# Altium footprint library SG__PCB_Modules.PcbLib: 73 footprints (part 5 of 5)
Each footprint in its own frame and in the unit in brackets; x right, y up, seen from the top. Pads: shape width x height; smd on the part's side, far side on the other; paste and mask are expansions set on the pad; w line width, h text height; cw(c..) or ccw(c..) is an arc to the next point about the centre after c.
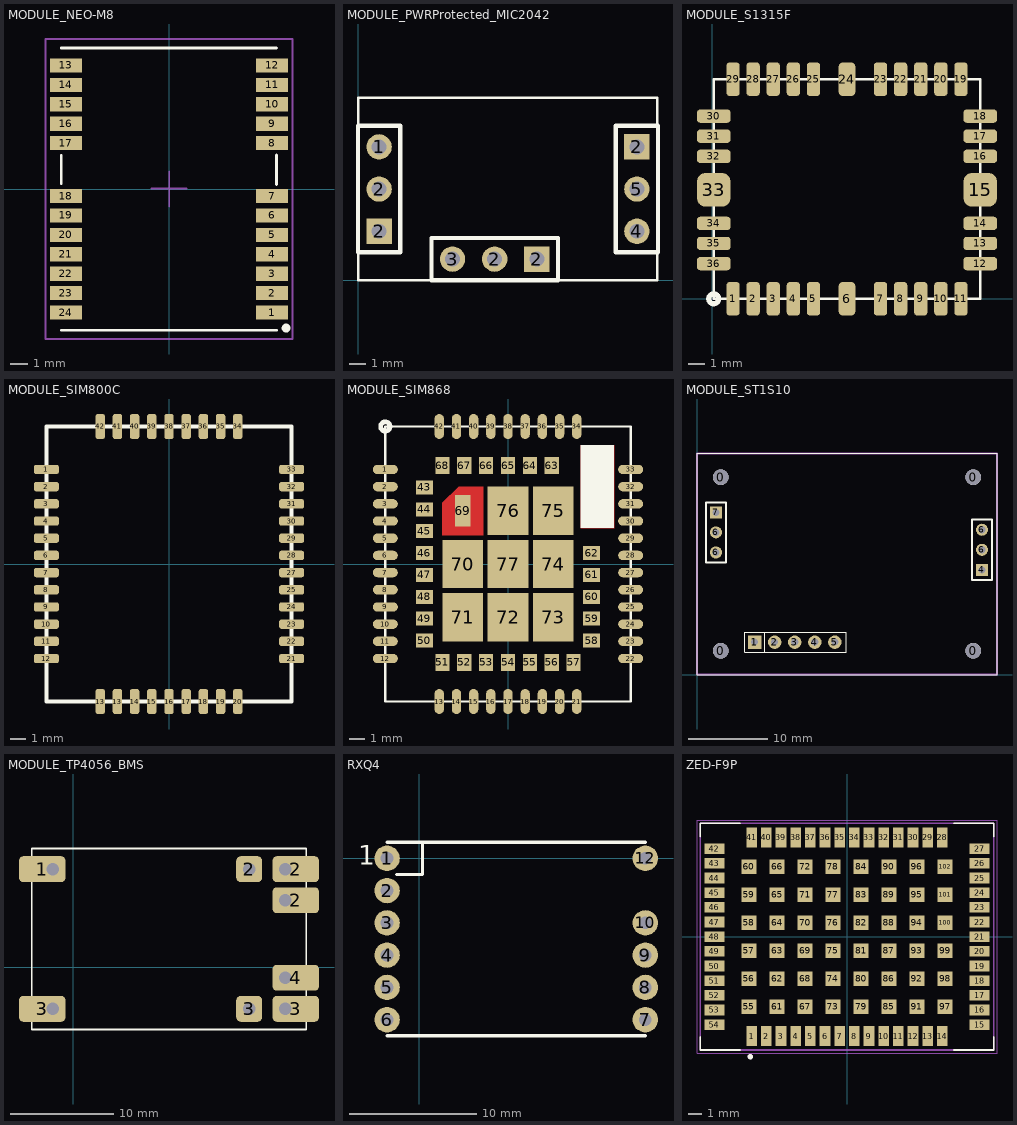
[diagram p4: the footprints below, top view; thin cyan lines are the x and y axes]

## MODULE_NEO-M8 [mm] "u-blox NEO GNSS module"
pads (24):
  rect 1.8x0.8 smd paste-0.1: 1(5.842,-7) 2(5.842,-5.9) 3(5.842,-4.8) 4(5.842,-3.7) 5(5.842,-2.6) 6(5.842,-1.5) 7(5.842,-0.4) 8(5.842,2.6) 9(5.842,3.7) 10(5.842,4.8) 11(5.842,5.9) 12(5.842,7) 13(-5.842,7) 14(-5.842,5.9) 15(-5.842,4.8) 16(-5.842,3.7) 17(-5.842,2.6) 18(-5.842,-0.4) 19(-5.842,-1.5) 20(-5.842,-2.6) 21(-5.842,-3.7) 22(-5.842,-4.8) 23(-5.842,-5.9) 24(-5.842,-7)
Top Overlay:
  circle w0.38: c6.636,-7.879 r0.058
  lines w0.16: -6.109,-8 6.096,-8 ; -6.109,7.996 6.09,7.996 ; -6.102,0.299 -6.102,1.893 ; 6.096,0.255 6.096,1.919
Top Paste:
  rectangle: -6.833,-4.1 -5.633,-3.3
  rectangle: -6.833,-7.4 -5.633,-6.6
  rectangle: -6.833,-6.3 -5.633,-5.5
  rectangle: -6.833,-5.2 -5.633,-4.4
  rectangle: -6.833,-3 -5.633,-2.2
  rectangle: -6.833,-1.9 -5.633,-1.1
  rectangle: -6.833,-0.8 -5.633,0
  rectangle: -6.833,2.2 -5.633,3
  rectangle: -6.833,3.3 -5.633,4.1
  rectangle: -6.833,4.4 -5.633,5.2
  rectangle: -6.833,5.5 -5.633,6.3
  rectangle: -6.833,6.6 -5.633,7.4
  rectangle: 5.642,6.6 6.842,7.4
  rectangle: 5.642,5.5 6.842,6.3
  rectangle: 5.642,4.4 6.842,5.2
  rectangle: 5.642,3.3 6.842,4.1
  rectangle: 5.642,2.2 6.842,3
  rectangle: 5.642,-0.8 6.842,0
  rectangle: 5.642,-1.9 6.842,-1.1
  rectangle: 5.642,-3 6.842,-2.2
  rectangle: 5.642,-4.1 6.842,-3.3
  rectangle: 5.642,-5.2 6.842,-4.4
  rectangle: 5.642,-6.3 6.842,-5.5
  rectangle: 5.642,-7.4 6.842,-6.6
Mechanical 13:
  text ".Designator" at -5.585,9.867 h1
Mechanical 15:
  lines w0.1: -1,0.024 0.02,0.024 ; 0.02,-1 0.02,0.024 ; 0.02,1 0.02,0.024 ; 1,0.024 0.02,0.024 ; -7,-8.5 -7,8.5 7,8.5 7,-8.5 -7,-8.5
3D body "NEO (STEP-AP214)_B.STEP": height 2.28, standoff -0.05, extent -6.104,-8 6.096,8

## MODULE_PWRProtected_MIC2042 [mil]
pads (9):
  round 60 hole 35.43: 1(49.16,316.38) 2(49.16,216.38) 2(323.16,50.38) 3(223.16,50.38) 4(660.16,116.38) 5(660.16,216.38)
  rect 60x60 hole 35.43: 2(49.16,116.38) 2(423.16,50.38) 2(660.16,316.38)
Top Overlay:
  lines w6: 0,0 708.66,0 708.66,433.07 0,433.07 0,0
  lines w10: -0.84,66.38 99.16,66.38 99.16,366.38 -0.84,366.38 -0.84,66.38 ; 173.16,0.38 473.16,0.38 473.16,100.38 173.16,100.38 173.16,0.38 ; 610.16,66.38 710.16,66.38 710.16,366.38 610.16,366.38 610.16,66.38
3D body "PLS1.stp": height 336.22, standoff -118.11, extent -0.85,266.38 99.15,366.38
3D body "PLS1.stp": height 336.22, standoff -118.11, extent -0.85,166.38 99.15,266.38
3D body "PLS1.stp": height 336.22, standoff -118.11, extent -0.85,66.38 99.15,166.38
3D body "PLS1.stp": height 336.22, standoff -118.11, extent 610.16,66.38 710.16,166.38
3D body "PLS1.stp": height 336.22, standoff -118.11, extent 610.16,166.38 710.16,266.38
3D body "PLS1.stp": height 336.22, standoff -118.11, extent 610.16,266.38 710.16,366.38
3D body "PLS1.stp": height 336.22, standoff -118.11, extent 173.15,0.38 273.15,100.38
3D body "PLS1.stp": height 336.22, standoff -118.11, extent 273.15,0.38 373.15,100.38
3D body "PLS1.stp": height 336.22, standoff -118.11, extent 373.15,0.38 473.15,100.38

## MODULE_S1315F [mm]
pads (36):
  rrect50% 0.8x2 smd mask+0.05: 1(1.25,0) 2(2.45,0) 3(3.65,0) 4(4.85,0) 5(6.05,0) 7(10.05,0) 8(11.25,0) 9(12.45,0) 10(13.65,0) 11(14.85,0) 19(14.85,13.1) 20(13.65,13.1) 21(12.45,13.1) 22(11.25,13.1) 23(10.05,13.1) 25(6.05,13.1) 26(4.85,13.1) 27(3.65,13.1) 28(2.45,13.1) 29(1.25,13.1)
  rrect50% 1x2 smd mask+0.05: 6(8.05,0) 24(8.05,13.1)
  rrect50% 2x0.8 smd mask+0.05: 12(16,2.1) 13(16,3.3) 14(16,4.5) 16(16,8.5) 17(16,9.7) 18(16,10.9) 30(0.1,10.9) 31(0.1,9.7) 32(0.1,8.5) 34(0.1,4.5) 35(0.1,3.3) 36(0.1,2.1)
  rrect50% 2x2 smd mask+0.05: 15(16,6.5) 33(0.1,6.5)
Top Overlay:
  circle w0.3: c0.1,0 r0.3
  lines w0.152: 0.1,0 16,0 16,13.1 0.1,13.1 0.1,0
3D body: height 1.5, standoff 0.1, extent 0.1,0 16,13.1

## MODULE_SIM800C [mm] "SIM800C"
pads (42):
  rrect50% 1.6x0.6 smd: 1(-7.85,6.05) 2(-7.85,4.95) 3(-7.85,3.85) 4(-7.85,2.75) 5(-7.85,1.65) 6(-7.85,0.55) 7(-7.85,-0.55) 8(-7.85,-1.65) 9(-7.85,-2.75) 10(-7.85,-3.85) 11(-7.85,-4.95) 12(-7.85,-6.05) 21(7.85,-6.05) 22(7.85,-4.95) 23(7.85,-3.85) 24(7.85,-2.75) 25(7.85,-1.65) 27(7.85,-0.55) 28(7.85,0.55) 29(7.85,1.65) 30(7.85,2.75) 31(7.85,3.85) 32(7.85,4.95) 33(7.85,6.05)
  rrect50% 0.6x1.6 smd: 13(-4.4,-8.8) 13(-3.3,-8.8) 14(-2.2,-8.8) 15(-1.1,-8.8) 16(0,-8.8) 17(1.1,-8.8) 18(2.2,-8.8) 19(3.3,-8.8) 20(4.4,-8.8) 34(4.4,8.8) 35(3.3,8.8) 36(2.2,8.8) 37(1.1,8.8) 38(0,8.8) 39(-1.1,8.8) 40(-2.2,8.8) 41(-3.3,8.8) 42(-4.4,8.8)
Top Overlay:
  lines w0.254: -7.85,-8.8 -7.85,8.8 7.85,8.8 7.85,-8.8 -7.85,-8.8
3D body "SIM800C-1.STEP": height 2.32, standoff -0.02, extent -7.85,-8.8 7.85,8.8

## MODULE_SIM868 [mm]
height 2.4
pads (77):
  oval 1.6x0.6 smd: 1(-7.85,6.05) 2(-7.85,4.95) 3(-7.85,3.85) 4(-7.85,2.75) 5(-7.85,1.65) 6(-7.85,0.55) 7(-7.85,-0.55) 8(-7.85,-1.65) 9(-7.85,-2.75) 10(-7.85,-3.85) 11(-7.85,-4.95) 12(-7.85,-6.05) 22(7.85,-6.05) 23(7.85,-4.95) 24(7.85,-3.85) 25(7.85,-2.75) 26(7.85,-1.65) 27(7.85,-0.55) 28(7.85,0.55) 29(7.85,1.65) 30(7.85,2.75) 31(7.85,3.85) 32(7.85,4.95) 33(7.85,6.05)
  oval 0.6x1.6 smd: 13(-4.4,-8.8) 14(-3.3,-8.8) 15(-2.2,-8.8) 16(-1.1,-8.8) 17(0,-8.8) 18(1.1,-8.8) 19(2.2,-8.8) 20(3.3,-8.8) 21(4.4,-8.8) 34(4.4,8.8) 35(3.3,8.8) 36(2.2,8.8) 37(1.1,8.8) 38(0,8.8) 39(-1.1,8.8) 40(-2.2,8.8) 41(-3.3,8.8) 42(-4.4,8.8)
  rect 1.1x0.9 smd: 43(-5.35,4.9) 44(-5.35,3.5) 45(-5.35,2.1) 46(-5.35,0.7) 47(-5.35,-0.7) 48(-5.35,-2.1) 49(-5.35,-3.5) 50(-5.35,-4.9) 58(5.35,-4.9) 59(5.35,-3.5) 60(5.35,-2.1) 61(5.35,-0.7) 62(5.35,0.7)
  rect 0.9x1.1 smd: 51(-4.2,-6.3) 52(-2.8,-6.3) 53(-1.4,-6.3) 54(0,-6.3) 55(1.4,-6.3) 56(2.8,-6.3) 57(4.2,-6.3) 63(2.8,6.3) 64(1.4,6.3) 65(0,6.3) 66(-1.4,6.3) 67(-2.8,6.3) 68(-4.2,6.3)
  rect 1x2 smd: 69(-2.9,3.4)
  rect 2.6x3.1 smd: 70(-2.9,0) 71(-2.9,-3.4) 72(0,-3.4) 73(2.9,-3.4) 74(2.9,0) 75(2.9,3.4) 76(0,3.4) 77(0,0)
Top Layer:
  region: -4.2,1.85 -1.6,1.85 -1.6,4.95 -3.15,4.95 -4.2,3.925
  pour cut-out: 4.65,2.3 6.8,2.3 6.8,7.6 4.65,7.6
Top Overlay:
  circle w0.3: c-7.85,8.8 r0.3
  rectangle: 4.65,2.3 6.8,7.6
  lines w0.152: -7.85,-8.8 -7.85,8.8 7.85,8.8 7.85,-8.8 -7.85,-8.8
3D body "SIM868.SLDPRT": height 2.44, standoff -0.01, extent -7.85,-8.8 7.85,8.8

## MODULE_ST1S10 [mm]
pads (15):
  round 2 on Top Overlay hole 2 unplated: 0(3,3) 0(3,25) 0(35,3) 0(35,25)
  rect 1.7x1.7 hole 0.9 mask+0.05: 1(7.3,4.1)
  round 1.7 hole 0.9 mask+0.05: 2(9.84,4.1) 3(12.38,4.1) 4(14.92,4.1) 5(17.46,4.1)
  rect 1.524x1.524 hole 0.9: 4(36.1,13.26) 7(2.4,20.54)
  round 1.524 hole 0.9: 6(2.4,15.46) 6(2.4,18) 6(36.1,15.8) 6(36.1,18.34)
Top Overlay:
  lines w0.127: 0,0 38,0 38,28 0,28 0,0
  lines w0.15: 8.57,2.83 8.57,5.37 ; 6.03,2.83 18.9,2.83 18.9,5.37 6.03,5.37 6.03,2.83
  lines w0.254: 1.13,14.19 3.67,14.19 3.67,21.81 1.13,21.81 1.13,14.19 ; 34.83,11.99 37.37,11.99 37.37,19.61 34.83,19.61 34.83,11.99
Assembly Top:
  lines w0.254: 0,0 38,0 38,28 0,28 0,0
3D body "PLS1.stp": height 8.54, standoff -3, extent 1.13,14.19 3.67,16.73
3D body "PLS1.stp": height 8.54, standoff -3, extent 1.13,16.73 3.67,19.27
3D body "PLS1.stp": height 8.54, standoff -3, extent 1.13,19.27 3.67,21.81
3D body "RES 0603.step": height 0.45, standoff 0, extent 2.055,9.674 2.875,11.275
3D body "RES 0603.step": height 0.45, standoff 0, extent 5.074,7.825 6.675,8.645
3D body "SOT-23-1.STEP": height 0.99, standoff 0.01, extent 4.48,11.466 7.4,14.014
3D body "RES 0603.step": height 0.45, standoff 0, extent 5.175,9.655 6.776,10.475
3D body "PLS1.stp": height 8.54, standoff -3, extent 6.03,2.83 8.57,5.37
3D body "RES 0603.step": height 0.45, standoff 0, extent 8.055,14.074 8.875,15.675
3D body "PLS1.stp": height 8.54, standoff -3, extent 8.57,2.83 11.11,5.37
3D body "User Library-DO-214AB(SMC).step": height 2.77, standoff 0.13, extent 7.003,19.973 15.131,26.272
3D body "Chip Cap_MLCC_0805.step": height 0.6, standoff 0, extent 10.265,16.765 12.265,18.015
3D body "PLS1.stp": height 8.54, standoff -3, extent 11.11,2.83 13.65,5.37
3D body "PLS1.stp": height 8.54, standoff -3, extent 13.65,2.83 16.19,5.37
3D body "Chip Cap_MLCC_0603.step": height 0.5, standoff 0, extent 15.071,13.174 15.871,14.774
3D body "PLS1.stp": height 8.54, standoff -3, extent 16.19,2.83 18.73,5.37
3D body "RES 0603.step": height 0.45, standoff 0, extent 22.225,5.955 23.826,6.775
3D body "RES 0603.step": height 0.45, standoff 0, extent 25.525,5.955 27.125,6.775
3D body "Chip Cap_MLCC_0603.step": height 0.5, standoff 0, extent 27.174,7.729 28.774,8.529
3D body "TECAP C.step": height 2.5, standoff 0, extent 17.889,7.8 23.889,11
3D body "RES 0603.step": height 0.45, standoff 0, extent 34.474,9.025 36.075,9.845
3D body "RES 1206.step": height 0.57, standoff 0, extent 25.751,9.659 28.851,11.211
3D body "PLS1.stp": height 8.54, standoff -3, extent 34.83,11.99 37.37,14.53
3D body "PLS1.stp": height 8.54, standoff -3, extent 34.83,14.53 37.37,17.07
3D body "sru8028.stp": height 2.8, standoff 0, extent 17.2,11.8 25.2,19.8
3D body "User Library-DO-214AB(SMC).step": height 2.77, standoff 0.13, extent 28.073,12.259 34.372,20.387
3D body "Chip Cap_MLCC_0603.step": height 0.5, standoff 0, extent 26.371,15.675 27.171,17.275
3D body "PLS1.stp": height 8.54, standoff -3, extent 34.83,17.07 37.37,19.61
3D body "TECAP B.step": height 1.9, standoff 0, extent 24.574,21.1 28.074,23.9

## MODULE_TP4056_BMS [mm]
height 3
pads (8):
  rrect33% 4.5x2.5 all layers, no hole mask+0.05: 1(-3,9.5) 2(21.5,6.5) 2(21.5,9.5) 3(-3,-4) 3(21.5,-4) 4(21.5,-1)
  rrect33% 2.5x2.5 all layers, no hole mask+0.05: 2(17,9.5) 3(17,-4)
via 20.5,-4 diameter 1.2 hole 1.2
via 20.5,-1 diameter 1.2 hole 1.2
via 20.5,6.5 diameter 1.2 hole 1.2
via 20.5,9.5 diameter 1.2 hole 1.2
via -2,9.5 diameter 1.2 hole 1.2
via -2,-4 diameter 1.2 hole 1.2
via 17,9.5 diameter 1.2 hole 1.2
via 17,-4 diameter 1.2 hole 1.2
Top Overlay:
  lines w0.152: -4,-6 -4,11.5 22.5,11.5 22.5,-6 -4,-6
3D body: height 3, standoff 0.3, extent -3.75,-5.75 22.25,11.25

## RXQ4 [mm]
pads (11):
  round 2 hole 1: 1(-2.54,0) 2(-2.54,-2.54) 3(-2.54,-5.08) 4(-2.54,-7.62) 5(-2.54,-10.16) 6(-2.54,-12.7) 7(17.78,-12.7) 8(17.78,-10.16) 9(17.78,-7.62) 10(17.78,-5.08) 12(17.78,0)
Top Overlay:
  lines w0.254: -2.54,-13.97 17.78,-13.97 ; -2.54,1.27 17.78,1.27 ; -1.778,-1.27 0.254,-1.27 0.254,1.27 0,1.27
  text "1" at -4.826,-0.508 h1.52
3D body "RXQ4.stp": height 5.41, standoff -2, extent -2.84,-13.97 18.08,1.27

## ZED-F9P [mm]
height 2.6
pads (102):
  rect 0.8x1.5 smd paste-2: 1(-7.15,-7.45) 2(-6.05,-7.45) 3(-4.95,-7.45) 4(-3.85,-7.45) 5(-2.75,-7.45) 6(-1.65,-7.45) 7(-0.55,-7.45) 8(0.55,-7.45) 9(1.65,-7.45) 10(2.75,-7.45) 11(3.85,-7.45) 12(4.95,-7.45) 13(6.05,-7.45) 14(7.15,-7.45) 28(7.15,7.45) 29(6.05,7.45) 30(4.95,7.45) 31(3.85,7.45) 32(2.75,7.45) 33(1.65,7.45) 34(0.55,7.45) 35(-0.55,7.45) 36(-1.65,7.45) 37(-2.75,7.45) 38(-3.85,7.45) 39(-4.95,7.45) 40(-6.05,7.45) 41(-7.15,7.45)
  rect 1.5x0.8 smd paste-2: 15(9.95,-6.6) 16(9.95,-5.5) 17(9.95,-4.4) 18(9.95,-3.3) 19(9.95,-2.2) 20(9.95,-1.1) 21(9.95,0) 22(9.95,1.1) 23(9.95,2.2) 24(9.95,3.3) 25(9.95,4.4) 26(9.95,5.5) 27(9.95,6.6) 42(-9.95,6.6) 43(-9.95,5.5) 44(-9.95,4.4) 45(-9.95,3.3) 46(-9.95,2.2) 47(-9.95,1.1) 48(-9.95,0) 49(-9.95,-1.1) 50(-9.95,-2.2) 51(-9.95,-3.3) 52(-9.95,-4.4) 53(-9.95,-5.5) 54(-9.95,-6.6)
  rect 1.1x1.1 smd paste-0.025: 55(-7.35,-5.25) 56(-7.35,-3.15) 57(-7.35,-1.05) 58(-7.35,1.05) 59(-7.35,3.15) 60(-7.35,5.25) 61(-5.25,-5.25) 62(-5.25,-3.15) 63(-5.25,-1.05) 64(-5.25,1.05) 65(-5.25,3.15) 66(-5.25,5.25) 67(-3.15,-5.25) 68(-3.15,-3.15) 69(-3.15,-1.05) 70(-3.15,1.05) 71(-3.15,3.15) 72(-3.15,5.25) 73(-1.05,-5.25) 74(-1.05,-3.15) 75(-1.05,-1.05) 76(-1.05,1.05) 77(-1.05,3.15) 78(-1.05,5.25) 79(1.05,-5.25) 80(1.05,-3.15) 81(1.05,-1.05) 82(1.05,1.05) 83(1.05,3.15) 84(1.05,5.25) 85(3.15,-5.25) 86(3.15,-3.15) 87(3.15,-1.05) 88(3.15,1.05) 89(3.15,3.15) 90(3.15,5.25) 91(5.25,-5.25) 92(5.25,-3.15) 93(5.25,-1.05) 94(5.25,1.05) 95(5.25,3.15) 96(5.25,5.25) 97(7.35,-5.25) 98(7.35,-3.15) 99(7.35,-1.05) 100(7.35,1.05) 101(7.35,3.15) 102(7.35,5.25)
Top Overlay:
  circle w0.2: c-7.25,-9 r0.1
  lines w0.127: -11,-7.5 -11,-8.5 -8,-8.5 ; -11,7.5 -11,8.5 -8,8.5 ; 8,-8.5 11,-8.5 11,-7.5 ; 8,8.5 11,8.5 11,7.5
Top Paste:
  drawing of 54 lines, arcs and shapes, not listed
Assembly Top:
  circle w0.2: c-7.25,-9 r0.1
  lines w0.127: -11,-8.5 11,-8.5 11,8.5 -11,8.5 -11,-8.5
Courtyard Top:
  lines w0.05: -11.25,-8.75 11.25,-8.75 11.25,8.75 -11.25,8.75 -11.25,-8.75
3D body "step_temp.STEP": height 2.6, standoff 0, extent -11,-8.5 11,8.5